# Altium footprint library Footprints.PcbLib: 207 footprints (part 5 of 13)
Each footprint in its own frame and in the unit in brackets; x right, y up, seen from the top. Pads: shape width x height; smd on the part's side, far side on the other; paste and mask are expansions set on the pad; w line width, h text height; cw(c..) or ccw(c..) is an arc to the next point about the centre after c.
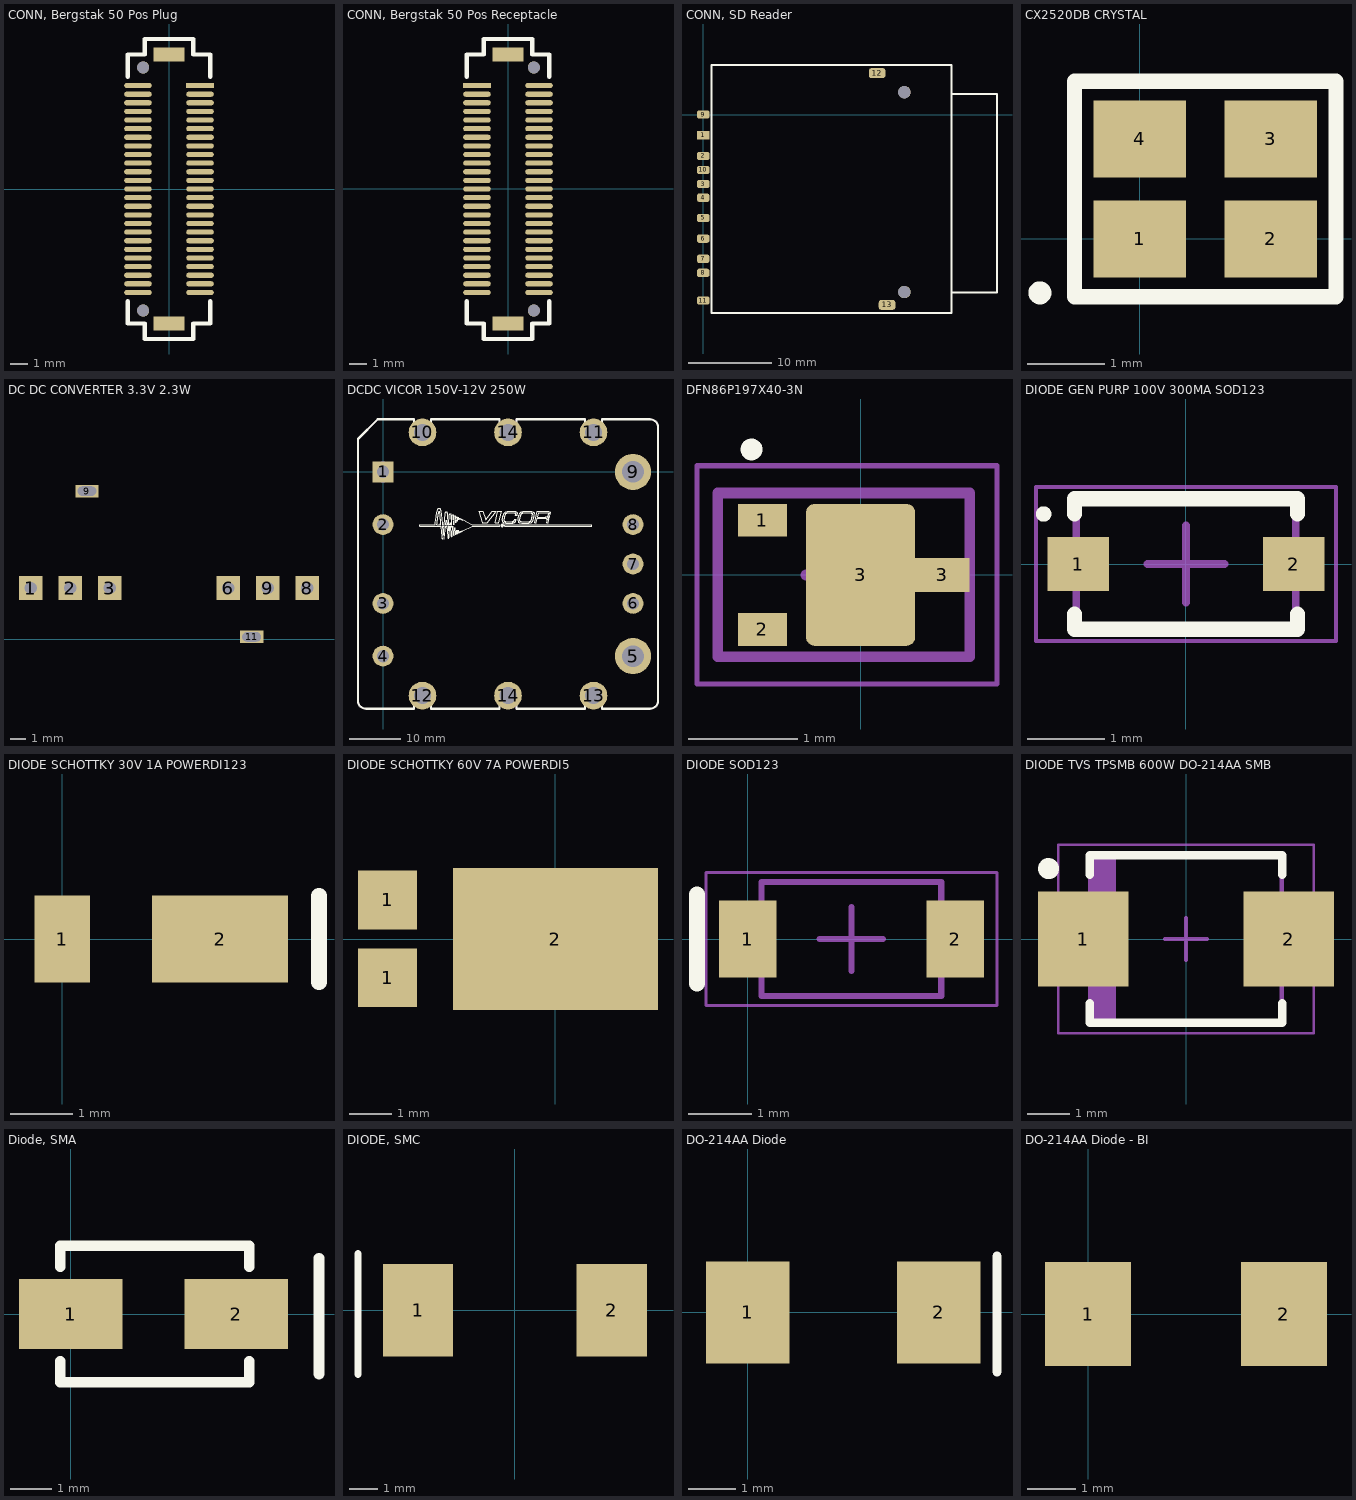
[diagram p4: the footprints below, top view; thin cyan lines are the x and y axes]

## CONN, Bergstak 50 Pos Plug [mm] "Bergstak 50 Position Plug"
pads (54):
  rect 1.6x0.3 smd: 1(1.8,6)
  oval 1.6x0.3 smd: 2(1.8,5.5) 3(1.8,5) 4(1.8,4.5) 5(1.8,4) 6(1.8,3.5) 7(1.8,3) 8(1.8,2.5) 9(1.8,2) 10(1.8,1.5) 11(1.8,1) 12(1.8,0.5) 13(1.8,0) 14(1.8,-0.5) 15(1.8,-1) 16(1.8,-1.5) 17(1.8,-2) 18(1.8,-2.5) 19(1.8,-3) 20(1.8,-3.5) 21(1.8,-4) 22(1.8,-4.5) 23(1.8,-5) 24(1.8,-5.5) 25(1.8,-6) 26(-1.8,-6) 27(-1.8,-5.5) 28(-1.8,-5) 29(-1.8,-4.5) 30(-1.8,-4) 31(-1.8,-3.5) 32(-1.8,-3) 33(-1.8,-2.5) 34(-1.8,-2) 35(-1.8,-1.5) 36(-1.8,-1) 37(-1.8,-0.5) 38(-1.8,0) 39(-1.8,0.5) 40(-1.8,1) 41(-1.8,1.5) 42(-1.8,2) 43(-1.8,2.5) 44(-1.8,3) 45(-1.8,3.5) 46(-1.8,4) 47(-1.8,4.5) 48(-1.8,5) 49(-1.8,5.5) 50(-1.8,6)
  round 0.7 hole 0.7: ""(-1.5,-7.05) ""(-1.5,7.05)
  rect 1.8x0.8 smd: ""(0,-7.8) ""(0,7.8)
Top Overlay:
  lines w0.254: -2.4,-6.5 -2.4,-7.8 -1.4,-7.8 -1.4,-8.7 1.4,-8.7 1.4,-7.8 2.4,-7.8 2.4,-6.5 ; -2.4,6.5 -2.4,7.8 -1.4,7.8 -1.4,8.7 1.4,8.7 1.4,7.8 2.4,7.8 2.4,6.5
3D body "10132797-055100LF.stp": height 4.2, standoff -0.6, extent -2.3,-7.75 2.3,7.75

## CONN, Bergstak 50 Pos Receptacle [mm] "Bergstak 50 Position Receptacle"
height 2.7
pads (54):
  rect 1.6x0.3 smd: 1(-1.8,6)
  oval 1.6x0.3 smd: 2(-1.8,5.5) 3(-1.8,5) 4(-1.8,4.5) 5(-1.8,4) 6(-1.8,3.5) 7(-1.8,3) 8(-1.8,2.5) 9(-1.8,2) 10(-1.8,1.5) 11(-1.8,1) 12(-1.8,0.5) 13(-1.8,0) 14(-1.8,-0.5) 15(-1.8,-1) 16(-1.8,-1.5) 17(-1.8,-2) 18(-1.8,-2.5) 19(-1.8,-3) 20(-1.8,-3.5) 21(-1.8,-4) 22(-1.8,-4.5) 23(-1.8,-5) 24(-1.8,-5.5) 25(-1.8,-6) 26(1.8,-6) 27(1.8,-5.5) 28(1.8,-5) 29(1.8,-4.5) 30(1.8,-4) 31(1.8,-3.5) 32(1.8,-3) 33(1.8,-2.5) 34(1.8,-2) 35(1.8,-1.5) 36(1.8,-1) 37(1.8,-0.5) 38(1.8,0) 39(1.8,0.5) 40(1.8,1) 41(1.8,1.5) 42(1.8,2) 43(1.8,2.5) 44(1.8,3) 45(1.8,3.5) 46(1.8,4) 47(1.8,4.5) 48(1.8,5) 49(1.8,5.5) 50(1.8,6)
  rect 1.8x0.8 smd: ""(0,-7.8) ""(0,7.8)
  round 0.7 hole 0.7: ""(1.5,-7.05) ""(1.5,7.05)
Top Overlay:
  lines w0.254: -2.4,-6.5 -2.4,-7.8 -1.4,-7.8 -1.4,-8.7 1.4,-8.7 1.4,-7.8 2.4,-7.8 2.4,-6.5 ; -2.4,6.5 -2.4,7.8 -1.4,7.8 -1.4,8.7 1.4,8.7 1.4,7.8 2.4,7.8 2.4,6.5
3D body "10132798-052100LF.stp": height 2.6, standoff -0.6, extent -2.3,-7.75 2.3,7.75

## CONN, SD Reader [mm] "101-00313-68-02CT-ND"
pads (15):
  rect 1.5x1 smd: 1(0,-2.5)
  rrect50% 1.5x1 smd: 2(0,-5) 3(0,-8.4) 4(0,-10.05) 5(0,-12.5) 6(0,-15) 7(0,-17.43) 8(0,-19.13) 9(0,0) 10(0,-6.7) 11(0,-22.48)
  rrect50% 2x1.2 smd: 12(21.01,5) 13(22.21,-23)
  round 1.5 hole 1.5: ""(24.31,-21.45) ""(24.31,2.7)
Top Overlay:
  lines w0.254: 1,-23.5 1,6 30,6 30,-24 1,-24 1,-23 ; 30,-21.5 35.5,-21.5 35.5,2.5 30,2.5

## CX2520DB CRYSTAL [mm]
pads (4):
  rect 1.2x1 smd: 1(0,0) 2(1.7,0) 3(1.7,1.3) 4(0,1.3)
Top Overlay:
  circle w0.2: c-1.3,-0.7 r0.05
  lines w0.2: -0.85,-0.75 2.55,-0.75 2.55,2.05 -0.85,2.05 -0.85,-0.75
3D body: height 0.5, standoff 0, extent -0.4,-0.35 2.1,1.65

## DC DC CONVERTER 3.3V 2.3W [mm]
pads (8):
  rect 1.524x1.524 hole 0.8: 1(2,3.3) 2(4.54,3.3) 3(7.08,3.3) 6(14.72,3.3) 8(19.8,3.3) 9(17.26,3.3)
  rect 1.5x0.8 hole 0.6 slot 1.2 at 0 deg: 9(5.618,9.541) 11(16.223,0.155)
3D body "tmr3wir-3d-drawing.step": height 0.6, standoff -14.7, extent 0,0 21.844,9.702
3D body: height 7.15, standoff -5.5, extent -167.578,109.851 -167.578,109.851

## DCDC VICOR 150V-12V 250W [mm]
pads (15):
  rect 4x4 hole 2.39: 1(0,0)
  round 4 hole 2.39: 2(0,-10.16) 3(0,-25.4) 4(0,-35.56) 6(48.26,-25.4) 7(48.26,-17.78) 8(48.26,-10.16)
  round 7 hole 4.16: 5(48.26,-35.56) 9(48.26,0)
  round 5.334 hole 3.302: 10(7.62,7.62) 11(40.64,7.62) 12(7.62,-43.18) 13(40.64,-43.18) 14(24.13,-43.18) 14(24.13,7.62)
Top Overlay:
  drawing of 1161 lines, arcs and shapes, not listed
Mechanical 1:
  circle w0.076: c0,0 r1.016
  circle w0.076: c0,0 r1.194
  circle w0.076: c0,0 r1.905
  lines w0.076: -4.826,-44.196 ccw(c-3.302,-44.196) -3.302,-45.72 5.982,-45.72 5.982,-43.18 cw(c7.62,-43.18) 9.258,-43.18 9.258,-45.72 22.492,-45.72 22.492,-43.18 cw(c24.13,-43.18) 25.768,-43.18 25.768,-45.72 39.002,-45.72 39.002,-43.18 cw(c40.64,-43.18) 42.278,-43.18 42.278,-45.72 51.562,-45.72 ccw(c51.562,-44.196) 53.086,-44.196 53.086,8.636 ccw(c51.562,8.636) 51.562,10.16 42.278,10.16 42.278,7.62 cw(c40.64,7.62) 39.002,7.62 39.002,10.16 25.768,10.16 25.768,7.62 cw(c24.13,7.62) 22.492,7.62 22.492,10.16 9.258,10.16 9.258,7.62 cw(c7.62,7.62) 5.982,7.62 5.982,10.16 -1.016,10.16 -4.826,6.35 -4.826,-44.196
Mechanical 2:
  circle w0.076: c0,0 r1.016
  circle w0.076: c0,0 r1.194
  circle w0.076: c0,0 r1.905
Drill Drawing:
  circle w0.076: c0,0 r1.194
3D body "37206r1-VxxBxxxxxxBLP.STP": height 11.44, standoff -4.63, extent -5.08,-45.888 53.006,10.16

## DFN86P197X40-3N [mm] "DFN, 3-Leads, Body 1.47x1.97mm, Pitch 0.86mm, IPC Medium Density"
height 0.4
pads (4):
  rect 0.45x0.3 smd: 1(-0.9,0.5) 2(-0.9,-0.5)
  rrect15% 1x1.3 smd: 3(0,0)
  rect 0.5x0.31 smd: 3(0.75,0)
Top Overlay:
  circle w0.1: c-1,1.15 r0.05
Mechanical 13:
  lines w0.1: -1.31,-0.75 -1.31,0.75 1,0.75 1,-0.75 -1.31,-0.75
Mechanical 15:
  lines w0.05: -1.5,-1 -1.5,1 1.25,1 1.25,-1 -1.5,-1
  lines w0.1: -0.5,0 0.5,0 ; 0,-0.5 0,0.5
3D body "DFN86P197X40-3N.step": height 0.4, standoff 0, extent -1.31,-0.75 1,0.75

## DIODE GEN PURP 100V 300MA SOD123 [mm] "Diode Standard 100V 300mA (DC) Surface Mount SOD-123"
height 1.35
pads (2):
  rect 0.8x0.7 smd: 1(-1.4,0) 2(1.4,0)
Top Overlay:
  circle w0.1: c-1.85,0.65 r0.05
  lines w0.2: -1.45,-0.65 -1.45,-0.85 1.45,-0.85 1.45,-0.65 ; -1.45,0.65 -1.45,0.85 1.45,0.85 1.45,0.65
Mechanical 13:
  lines w0.1: -1.425,-0.85 1.425,-0.85 1.425,0.85 -1.425,0.85 -1.425,-0.85
Mechanical 15:
  lines w0.05: -1.95,-1 1.95,-1 1.95,1 -1.95,1 -1.95,-1
  lines w0.1: -0.5,0 0.5,0 ; 0,-0.5 0,0.5
3D body "DIODE GEN PURP 100V 300MA SOD123.step": height 1.35, standoff 0, extent -1.425,-0.85 1.425,0.85

## DIODE SCHOTTKY 30V 1A POWERDI123 [mm] "Diodes Incorporated DFLS130L-7"
height 1
pads (2):
  rect 0.9x1.4 smd: 1(0,0)
  rect 2.2x1.4 smd: 2(2.55,0)
Top Overlay:
  lines w0.254: 4.15,-0.7 4.15,0.7
3D body "PowerDI123.stp": height 0.98, standoff 0, extent -0.274,-0.88 3.424,0.9

## DIODE SCHOTTKY 60V 7A POWERDI5 [mm] "Diode Schottky 60V 7A Surface Mount PowerDI™ 5"
pads (3):
  rect 1.4x1.39 smd: 1(-3.975,-0.915) 1(-3.975,0.925)
  rect 4.86x3.36 smd: 2(0,0)

## DIODE SOD123 [mm]
pads (2):
  rect 0.91x1.22 smd: 1(0,0) 2(3.28,0)
Top Overlay:
  lines w0.254: -0.8,-0.7 -0.8,0.7
Mechanical 13:
  lines w0.1: 0.22,-0.9 0.22,0.9 3.06,0.9 3.06,-0.9 0.22,-0.9
Mechanical 15:
  lines w0.05: -0.66,-1.05 -0.66,1.05 3.94,1.05 3.94,-1.05 -0.66,-1.05
  lines w0.1: 1.14,0 2.14,0 ; 1.64,-0.5 1.64,0.5
3D body "DIODE SCHOTTKY 30V 200MA SOD123.step": height 1.35, standoff 0, extent -0.215,-0.9 3.495,0.9

## DIODE TVS TPSMB 600W DO-214AA SMB [mm] "Littlefuse TPSMB"
height 2.44
pads (2):
  rect 2.16x2.26 smd: 1(-2.451,0) 2(2.451,0)
Top Overlay:
  circle w0.25: c-3.281,1.68 r0.125
  lines w0.2: -2.3,-1.53 -2.3,-2 2.3,-2 2.3,-1.53 ; -2.3,1.53 -2.3,2 2.3,2 2.3,1.53
Mechanical 13:
  rectangle: -2.285,-1.97 -1.67,1.97
  lines w0.1: -2.285,-1.97 -2.285,1.97 2.285,1.97 2.285,-1.97 -2.285,-1.97
Mechanical 15:
  lines w0.05: -3.05,-2.25 -3.05,2.25 3.05,2.25 3.05,-2.25 -3.05,-2.25
  lines w0.1: -0.5,0 0.5,0 ; 0,-0.5 0,0.5
3D body "DIODE TVS TPSMB 600W DO-214AA SMB.step": height 2.44, standoff 0, extent -2.505,-1.97 2.505,1.97

## Diode, SMA [mm]
pads (2):
  rect 2.5x1.7 smd: 1(0,0) 2(4,0)
Top Overlay:
  lines w0.254: -0.254,-1.143 -0.254,-1.651 4.318,-1.651 4.318,-1.143 ; -0.254,1.143 -0.254,1.651 4.318,1.651 4.318,1.143 ; 6,-1.45 6,1.344
3D body "Diode SMA.stp": height 2.41, standoff 0, extent -0.69,-1.45 4.59,1.47

## DIODE, SMC [mm]
pads (2):
  rect 2.5x3.3 smd: 1(-3.45,0) 2(3.45,0)
Top Overlay:
  lines w0.254: -5.588,-2.286 -5.588,2.032
3D body "DO-214AC.stp": height 2.25, standoff -0.04, extent -2.74,-1.524 2.54,1.266

## DO-214AA Diode [mil] "Zener Diode 16V 5W SMBJ5353B-TP"
pads (2):
  rect 70x85 smd: 1(0,0) 2(160,0)
Top Overlay:
  lines w7.87: 208.66,-49.76 208.66,47.24
3D body "Diode SMA.stp": height 94.95, standoff 0, extent -21.26,-59.85 186.61,55.12

## DO-214AA Diode - BI [mil] "Zener Diode 16V 5W SMBJ5353B-TP"
pads (2):
  rect 70x85 smd: 1(0,0) 2(160,0)
3D body "Diode SMA.stp": height 94.95, standoff 0, extent -21.26,-59.84 186.61,55.12